# Altium footprint library MPBoard.PcbLib: 123 footprints (part 8 of 8)
Each footprint in its own frame and in the unit in brackets; x right, y up, seen from the top. Pads: shape width x height; smd on the part's side, far side on the other; paste and mask are expansions set on the pad; w line width, h text height; cw(c..) or ccw(c..) is an arc to the next point about the centre after c.
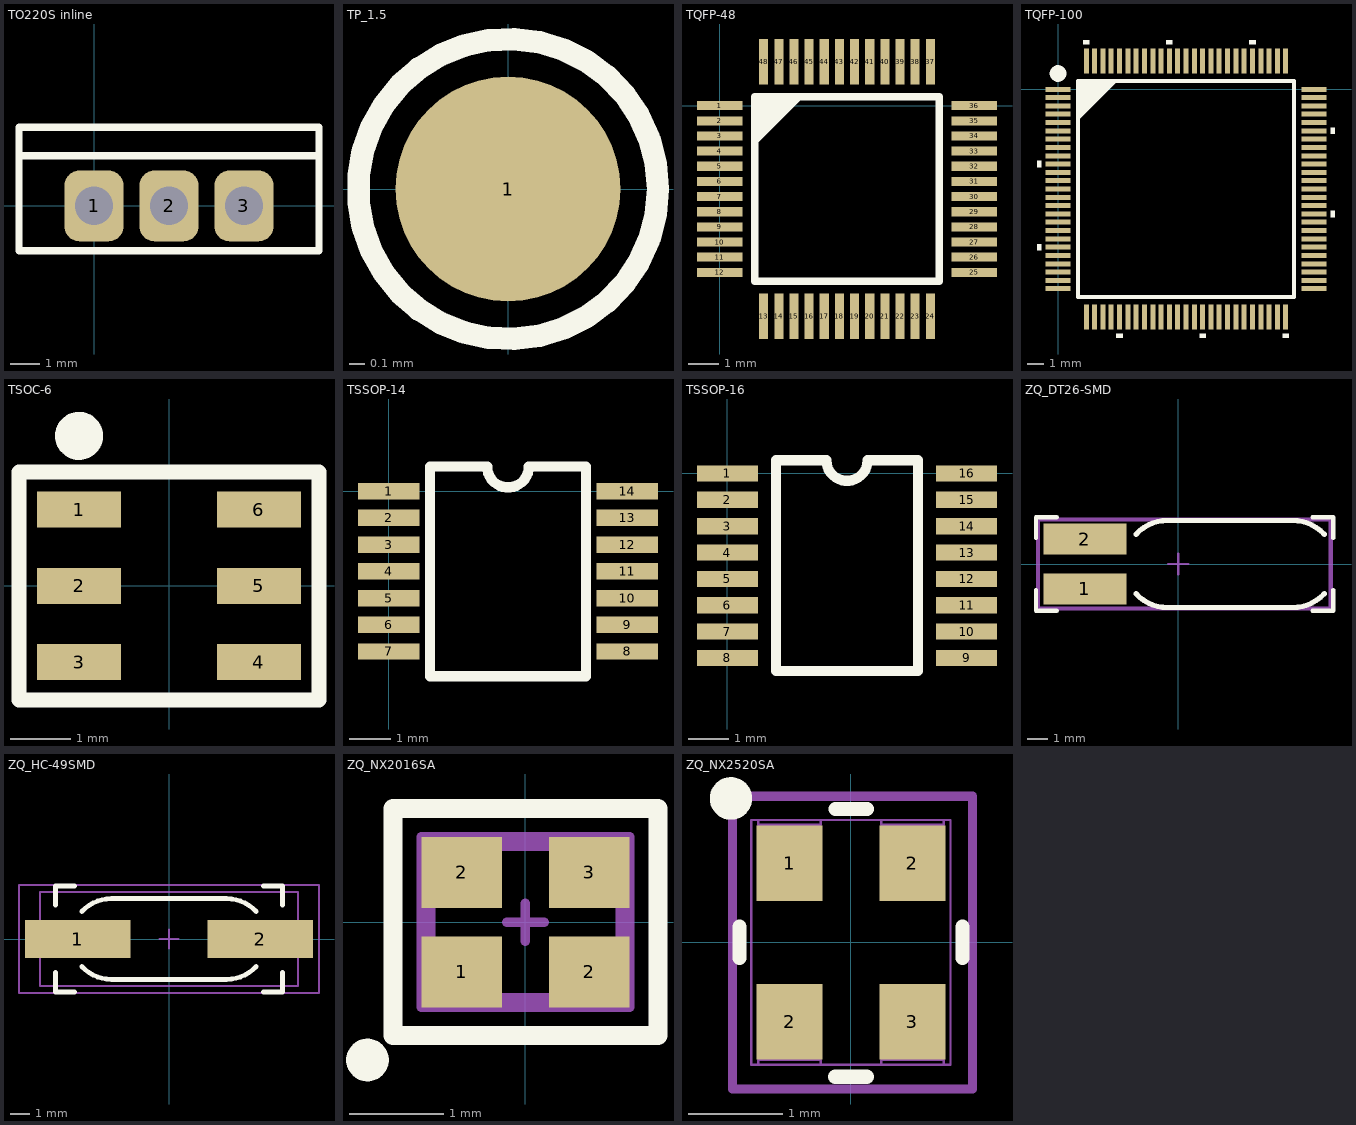
[diagram p7: the footprints below, top view; thin cyan lines are the x and y axes]

## TO220S inline [mm]
pads (3):
  rrect50% 2x2.4 hole 1.3: 1(0,0) 2(2.54,0) 3(5.08,0)
Top Overlay:
  lines w0.25: -2.54,1.7 7.62,1.7 ; -2.54,-1.524 7.62,-1.524 7.62,2.67 -2.54,2.67 -2.54,-1.524
3D body "TO220_AB PCB.step": height 20.05, standoff -3.5, extent -2.41,-1.55 7.49,2.907

## TP_1.5 [mm] "Test Point 1.5 mm"
pads (1):
  round 1.5 smd mask+0: 1(0,0)
Top Overlay:
  circle w0.15: c0,0 r1
Top Component Outline:
  circle w0.5: c0,0 r0.25
Top Courtyard:
  circle w0.1: c0,0 r0.65
3D body: height 0.01, standoff 0, extent -0.01,-0.01 0.01,0.01

## TQFP-48 [mm] "YB"
pads (48):
  rect 1.5x0.3 smd: 1(0,0) 2(0,-0.5) 3(0,-1) 4(0,-1.5) 5(0,-2) 6(0,-2.5) 7(0,-3) 8(0,-3.5) 9(0,-4) 10(0,-4.5) 11(0,-5) 12(0,-5.5) 25(8.4,-5.5) 26(8.4,-5) 27(8.4,-4.5) 28(8.4,-4) 29(8.4,-3.5) 30(8.4,-3) 31(8.4,-2.5) 32(8.4,-2) 33(8.4,-1.5) 34(8.4,-1) 35(8.4,-0.5) 36(8.4,0)
  rect 0.3x1.5 smd: 13(1.45,-6.95) 14(1.95,-6.95) 15(2.45,-6.95) 16(2.95,-6.95) 17(3.45,-6.95) 18(3.95,-6.95) 19(4.45,-6.95) 20(4.95,-6.95) 21(5.45,-6.95) 22(5.95,-6.95) 23(6.45,-6.95) 24(6.95,-6.95) 37(6.95,1.45) 38(6.45,1.45) 39(5.95,1.45) 40(5.45,1.45) 41(4.95,1.45) 42(4.45,1.45) 43(3.95,1.45) 44(3.45,1.45) 45(2.95,1.45) 46(2.45,1.45) 47(1.95,1.45) 48(1.45,1.45)
Top Overlay:
  region: 1.24,0.26 1.24,-1.24 2.74,0.26
  lines w0.25: 1.15,-5.8 7.25,-5.8 7.25,0.3 1.15,0.3 1.15,-5.8
3D body "PT0048A.stp": height 1.5, standoff 0, extent -0.293,-7.241 8.707,1.759

## TQFP-100 [mm] "YB, For Hand Solder"
pads (100):
  rect 1.5x0.3 smd: 1(0,0) 2(0,-0.5) 3(0,-1) 4(0,-1.5) 5(0,-2) 6(0,-2.5) 7(0,-3) 8(0,-3.5) 9(0,-4) 10(0,-4.5) 11(0,-5) 12(0,-5.5) 13(0,-6) 14(0,-6.5) 15(0,-7) 16(0,-7.5) 17(0,-8) 18(0,-8.5) 19(0,-9) 20(0,-9.5) 21(0,-10) 22(0,-10.5) 23(0,-11) 24(0,-11.5) 25(0,-12) 51(15.4,-12) 52(15.4,-11.5) 53(15.4,-11) 54(15.4,-10.5) 55(15.4,-10) 56(15.4,-9.5) 57(15.4,-9) 58(15.4,-8.5) 59(15.4,-8) 60(15.4,-7.5) 61(15.4,-7) 62(15.4,-6.5) 63(15.4,-6) 64(15.4,-5.5) 65(15.4,-5) 66(15.4,-4.5) 67(15.4,-4) 68(15.4,-3.5) 69(15.4,-3) 70(15.4,-2.5) 71(15.4,-2) 72(15.4,-1.5) 73(15.4,-1) 74(15.4,-0.5) 75(15.4,0)
  rect 0.3x1.5 smd: 26(1.7,-13.7) 27(2.2,-13.7) 28(2.7,-13.7) 29(3.2,-13.7) 30(3.7,-13.7) 31(4.2,-13.7) 32(4.7,-13.7) 33(5.2,-13.7) 34(5.7,-13.7) 35(6.2,-13.7) 36(6.7,-13.7) 37(7.2,-13.7) 38(7.7,-13.7) 39(8.2,-13.7) 40(8.7,-13.7) 41(9.2,-13.7) 42(9.7,-13.7) 43(10.2,-13.7) 44(10.7,-13.7) 45(11.2,-13.7) 46(11.7,-13.7) 47(12.2,-13.7) 48(12.7,-13.7) 49(13.2,-13.7) 50(13.7,-13.7) 76(13.7,1.7) 77(13.2,1.7) 78(12.7,1.7) 79(12.2,1.7) 80(11.7,1.7) 81(11.2,1.7) 82(10.7,1.7) 83(10.2,1.7) 84(9.7,1.7) 85(9.2,1.7) 86(8.7,1.7) 87(8.2,1.7) 88(7.7,1.7) 89(7.2,1.7) 90(6.7,1.7) 91(6.2,1.7) 92(5.7,1.7) 93(5.2,1.7) 94(4.7,1.7) 95(4.2,1.7) 96(3.7,1.7) 97(3.2,1.7) 98(2.7,1.7) 99(2.2,1.7) 100(1.7,1.7)
Top Overlay:
  circle w0.5: c0,0.95 r0.25
  rectangle: -1.25,-4.7 -1,-4.3
  rectangle: -1.25,-9.7 -1,-9.3
  region: 16.65,-7.3 16.4,-7.3 16.4,-7.7 16.65,-7.7
  region: 16.65,-2.3 16.4,-2.3 16.4,-2.7 16.65,-2.7
  region: 11.5,2.95 11.5,2.7 11.9,2.7 11.9,2.95
  region: 6.5,2.95 6.5,2.7 6.9,2.7 6.9,2.95
  region: 1.5,2.95 1.5,2.7 1.9,2.7 1.9,2.95
  region: 3.9,-14.95 3.9,-14.7 3.5,-14.7 3.5,-14.95
  region: 8.9,-14.95 8.9,-14.7 8.5,-14.7 8.5,-14.95
  region: 13.9,-14.95 13.9,-14.7 13.5,-14.7 13.5,-14.95
  region: 1.2,0.5 1.2,-1.9 3.6,0.5
  lines w0.25: 1.2,-12.5 1.2,0.5 14.2,0.5 14.2,-12.5 1.2,-12.5
3D body "TQFP100.STEP": height 1.99, standoff -0.01, extent -0.4,-14.1 15.8,2.1

## TSOC-6 [mm] "YB"
pads (6):
  rect 1.4x0.6 smd: 1(-1.5,1.27) 2(-1.5,0) 3(-1.5,-1.27) 4(1.5,-1.27) 5(1.5,0) 6(1.5,1.27)
Top Overlay:
  circle w0.4: c-1.5,2.5 r0.2
  lines w0.25: -2.5,-1.9 2.5,-1.9 2.5,1.9 -2.5,1.9 -2.5,-1.9
3D body "TSOC6.STEP": height 1.4, standoff 0, extent -2.1,-2 2.1,2

## TSSOP-14 [mm] "YB"
pads (14):
  rect 1.5x0.4 smd: 1(0,0) 2(0,-0.65) 3(0,-1.3) 4(0,-1.95) 5(0,-2.6) 6(0,-3.25) 7(0,-3.9) 8(5.8,-3.9) 9(5.8,-3.25) 10(5.8,-2.6) 11(5.8,-1.95) 12(5.8,-1.3) 13(5.8,-0.65) 14(5.8,0)
Top Overlay:
  lines w0.25: 1,-4.5 4.8,-4.5 4.8,0.6 3.408,0.6 cw(c2.9,0.6) 2.392,0.6 1,0.6 1,-4.5
3D body "TSSOP14.STEP": height 1.2, standoff 0, extent -0.284,-4.443 6.116,0.557

## TSSOP-16 [mm] "YB"
pads (16):
  rect 1.5x0.4 smd: 1(0,0) 2(0,-0.65) 3(0,-1.3) 4(0,-1.95) 5(0,-2.6) 6(0,-3.25) 7(0,-3.9) 8(0,-4.55) 9(5.9,-4.55) 10(5.9,-3.9) 11(5.9,-3.25) 12(5.9,-2.6) 13(5.9,-1.95) 14(5.9,-1.3) 15(5.9,-0.65) 16(5.9,0)
Top Overlay:
  lines w0.25: 1.2,-4.875 1.2,0.325 2.442,0.325 ccw(c2.95,0.325) 3.458,0.325 4.7,0.325 4.7,-4.875 1.2,-4.875
3D body "TSSOP16.STEP": height 1.2, standoff 0, extent -0.255,-4.788 6.145,0.212

## ZQ_DT26-SMD [mm] "Quartz"
height 3.5
pads (2):
  rect 4x1.5 smd: 1(-4.5,-1.2) 2(-4.5,1.2)
Top Overlay:
  lines w0.2: -6.85,-1.25 -6.85,-2.25 -5.85,-2.25 ; -6.85,1.25 -6.85,2.25 -5.85,2.25 ; 6.47,-2.25 7.47,-2.25 7.47,-1.25 ; 6.47,2.25 7.47,2.25 7.47,1.25
  lines w0.25: -2.039,-1.429 ccw(c-0.5,0) -0.5,-2.1 5.5,-2.1 ; -2.039,1.429 cw(c-0.5,0) -0.5,2.1 ; -0.5,2.1 5.5,2.1 cw(c5.5,0) 7.039,1.429 ; 5.5,-2.1 ccw(c5.5,0) 7.039,-1.429
Top Component Outline:
  lines w0.1: -6.7,-2.1 7.3,-2.1 7.3,2.1 -6.7,2.1 -6.7,-2.1
Top Courtyard:
  lines w0.1: -0.5,0 0.5,0 ; 0,-0.5 0,0.5 ; -6.8,-2.2 -6.8,2.2 7.4,2.2 7.4,-2.2 -6.8,-2.2
3D body "AB26T-32.768KHZ-E--3DModel-STEP-400430.STEP": height 1.05, standoff -1.06, extent -5.5,-1.05 6.7,1.05

## ZQ_HC-49SMD [mm] "Quartz"
height 3.5
pads (2):
  rect 5.5x2 smd: 1(-4.75,0) 2(4.75,0)
Top Overlay:
  lines w0.25: -5.9,-2.75 -4.9,-2.75 ; -5.9,-2.75 -5.9,-1.75 ; -5.9,1.75 -5.9,2.75 ; -5.9,2.75 -4.9,2.75 ; -4.539,-1.429 ccw(c-3,0) -3,-2.1 3,-2.1 ; -4.539,1.429 cw(c-3,0) -3,2.1 ; -3,2.1 3,2.1 cw(c3,0) 4.539,1.429 ; 3,-2.1 ccw(c3,0) 4.539,-1.429 ; 4.9,-2.75 5.9,-2.75 ; 4.9,2.75 5.9,2.75 ; 5.9,-2.75 5.9,-1.75 ; 5.9,1.75 5.9,2.75
Top Component Outline:
  lines w0.1: -6.7,-2.45 -6.7,2.45 6.7,2.45 6.7,-2.45 -6.7,-2.45
Top Courtyard:
  lines w0.1: -0.5,0 0.5,0 ; 0,-0.5 0,0.5 ; 7.8,2.697 7.8,2.8 ; 7.8,2.8 -7.8,2.8 -7.8,-2.8 7.8,-2.8 7.8,2.8
3D body "User Library-hc49_cystal.step": height 5.08, standoff 0, extent -6.7,-2.45 6.7,2.45

## ZQ_NX2016SA [mm] "NDK"
height 0.45
pads (4):
  rect 0.85x0.75 smd: 1(-0.675,-0.525) 2(-0.675,0.525) 2(0.675,-0.525) 3(0.675,0.525)
Top Overlay:
  circle w0.25: c-1.669,-1.457 r0.1
  lines w0.2: -1.4,-1.2 1.4,-1.2 1.4,1.2 -1.4,1.2 -1.4,-1.2
Top Component Outline:
  lines w0.1: -1,-0.8 -1,0.8 1,0.8 1,-0.8 -1,-0.8
Top Courtyard:
  lines w0.1: -0.2,0 0.2,0 ; 0,-0.2 0,0.2 ; -1.1,-0.9 1.1,-0.9 1.1,0.9 -1.1,0.9 -1.1,-0.9
3D body "User Library-050008031.step": height 0.45, standoff -0.01, extent -1,-0.8 1,0.8

## ZQ_NX2520SA [mm] "NDK"
pads (4):
  rect 0.7x0.8 smd paste+0 mask+0: 1(-0.65,0.838) 2(-0.65,-0.838) 2(0.65,0.838) 3(0.65,-0.838)
Top Overlay:
  circle w0.25: c-1.27,1.524 r0.1
  lines w0.15: -1.181,-0.167 -1.181,0.167 ; -0.167,-1.423 0.167,-1.423 ; -0.164,1.414 0.169,1.414 ; 1.181,-0.167 1.181,0.167
Mechanical 13:
  lines w0.025: -1.054,-1.295 -1.054,1.295 1.054,1.295 1.054,-1.295 -1.054,-1.295 ; -0.98,-1.295 -0.98,-1.245 -0.32,-1.245 -0.32,-1.295 -0.98,-1.295 ; -0.98,1.245 -0.98,1.295 -0.32,1.295 -0.32,1.245 -0.98,1.245 ; 0.32,-1.295 0.32,-1.245 0.98,-1.245 0.98,-1.295 0.32,-1.295 ; 0.32,1.245 0.32,1.295 0.98,1.295 0.98,1.245 0.32,1.245
Mechanical 15:
  lines w0.1: -1.254,-1.551 -1.254,1.549 1.286,1.549 1.286,-1.551 -1.254,-1.551
3D body "NX2520SA_NDK.step": height 0.56, standoff 0, extent -1.054,-1.295 1.054,1.295